# Altium footprint library MOLEX SMD.PcbLib: 54 footprints (part 4 of 4)
Each footprint in its own frame and in the unit in brackets; x right, y up, seen from the top. Pads: shape width x height; smd on the part's side, far side on the other; paste and mask are expansions set on the pad; w line width, h text height; cw(c..) or ccw(c..) is an arc to the next point about the centre after c.
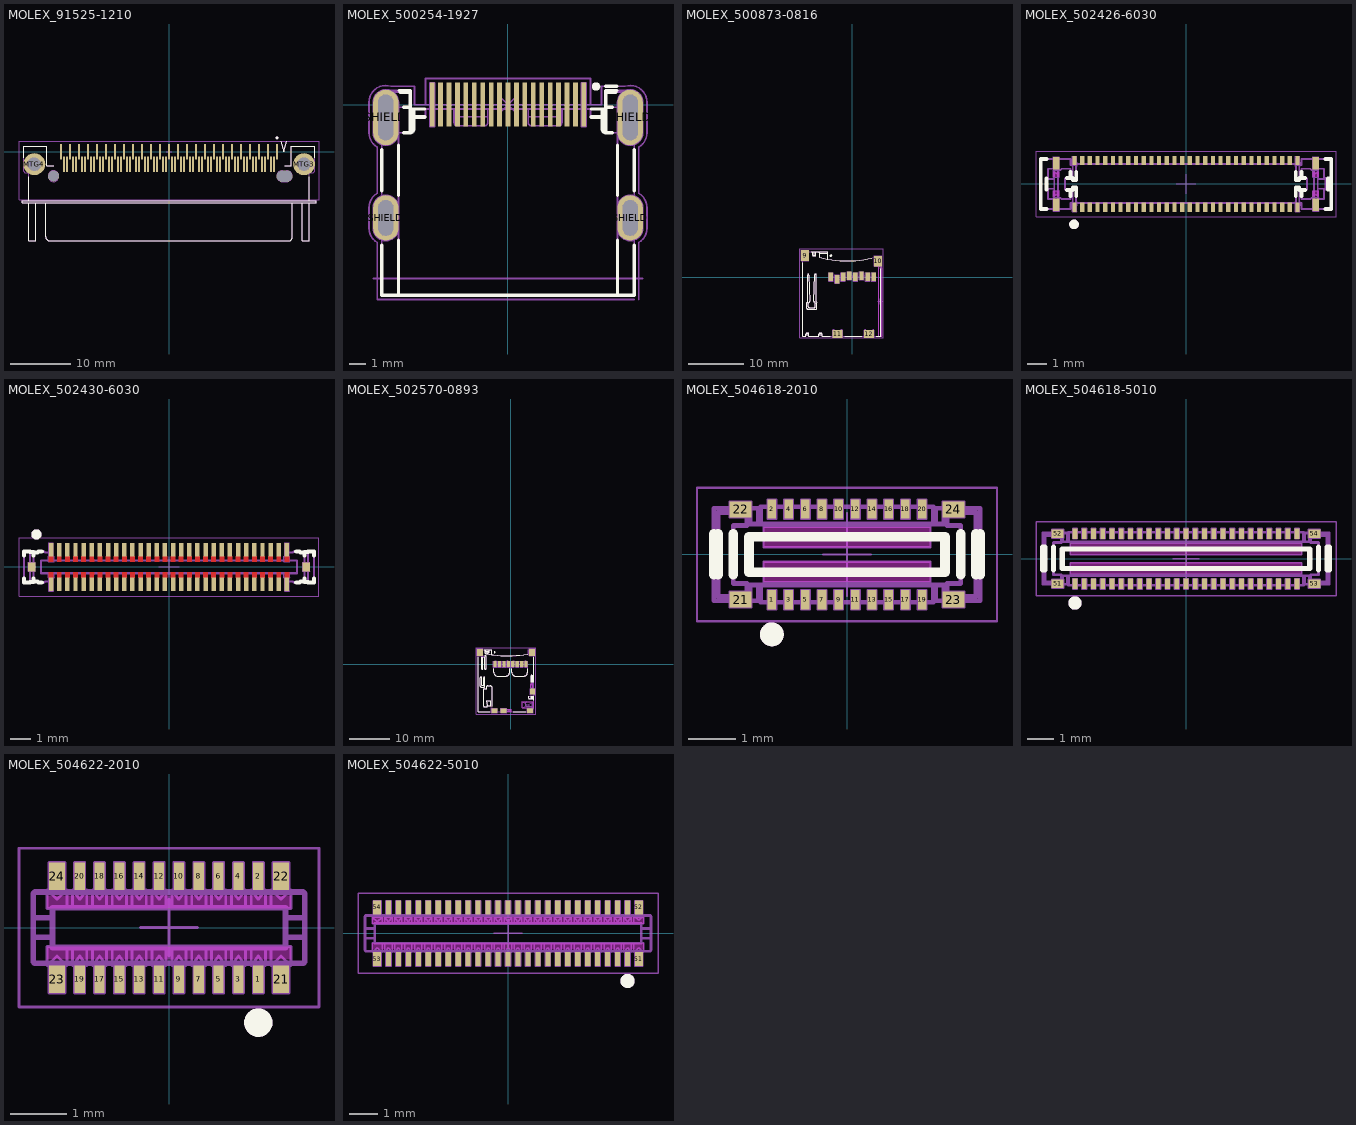
[diagram p3: the footprints below, top view; thin cyan lines are the x and y axes]

## MOLEX_91525-1210 [mm] "0.50mm (.020\") Pitch LaneLink I/O Latch Receptacle, 12 Lane, Cx4 Ethernet, 24 Circuits, 2 Screw Holes"
height 11
pads (77):
  rect 0.31x2.6 smd: G1(18,0) G2(16.5,0) G3(15,0) G4(13.5,0) G5(12,0) G6(10.5,0) G7(9,0) G8(7.5,0) G9(6,0) G10(4.5,0) G11(3,0) G12(1.5,0) G13(0,0) G14(-1.5,0) G15(-3,0) G16(-4.5,0) G17(-6,0) G18(-7.5,0) G19(-9,0) G20(-10.5,0) G21(-12,0) G22(-13.5,0) G23(-15,0) G24(-16.5,0) G25(-18,0) S1(17.5,-2.1) S2(17,-2.1) S3(16,-2.1) S4(15.5,-2.1) S5(14.5,-2.1) S6(14,-2.1) S7(13,-2.1) S8(12.5,-2.1) S9(11.5,-2.1) S10(11,-2.1) S11(10,-2.1) S12(9.5,-2.1) S13(8.5,-2.1) S14(8,-2.1) S15(7,-2.1) S16(6.5,-2.1) S17(5.5,-2.1) S18(5,-2.1) S19(4,-2.1) S20(3.5,-2.1) S21(2.5,-2.1) S22(2,-2.1) S23(1,-2.1) S24(0.5,-2.1) S25(-0.5,-2.1) S26(-1,-2.1) S27(-2,-2.1) S28(-2.5,-2.1) S29(-3.5,-2.1) S30(-4,-2.1) S31(-5,-2.1) S32(-5.5,-2.1) S33(-6.5,-2.1) S34(-7,-2.1) S35(-8,-2.1) S36(-8.5,-2.1) S37(-9.5,-2.1) S38(-10,-2.1) S39(-11,-2.1) S40(-11.5,-2.1) S41(-12.5,-2.1) S42(-13,-2.1) S43(-14,-2.1) S44(-14.5,-2.1) S45(-15.5,-2.1) S46(-16,-2.1) S47(-17,-2.1) S48(-17.5,-2.1)
  round 0.5 hole 1.85 unplated mask+0.675: MTG1(-19.245,-4.1)
  oval 2.1x1.35 hole 1.85 slot 2.6 at 0 deg unplated mask+0.25: MTG2(19.255,-4.1)
  round 3.65 hole 2.2: MTG3(22.5,-2.1) MTG4(-22.45,-2.1)
Top Overlay:
  circle w0.25: c18,2.3 r0.125
  lines w0.2: -24.245,-1 -24.245,0.9 -20.345,0.9 -20.345,-2.35 -19.245,-2.35 ; -23.395,-8.5 -23.395,-14.9 -22.195,-14.9 -22.195,-8.5 ; -23.395,-8.2 -23.395,-4.2 ; -20.56,-8.5 -20.56,-14.2 ccw(c-19.86,-14.2) -19.86,-14.9 19.87,-14.9 ccw(c19.87,-14.2) 20.57,-14.2 20.57,-8.5 ; 18.6,1.7 19.1,0 19.6,1.7 ; 19.255,-2.35 20.355,-2.35 20.355,0.9 24.255,0.9 24.255,-1 ; 22.205,-8.5 22.205,-14.9 23.405,-14.9 23.405,-8.5 ; 23.405,-8.2 23.405,-4.2 ; -24.495,-8.5 -24.495,-8.2 24.505,-8.2 24.505,-8.5 -24.495,-8.5
Mechanical 8:
  lines w0.1: -25,-8 25,-8
  text "PCB Edge" at -3.175,-7.525 h1.02
Mechanical 13:
  circle w0.1: c-22.445,-2.1 r1.1
  circle w0.1: c-19.245,-4.1 r0.91
  circle w0.1: c22.455,-2.1 r1.1
  lines w0.1: -23.545,-2.1 -22.445,-2.1 -22.445,-3.2 ; -19.245,-5.01 -19.245,-4.1 -18.335,-4.1 ; 17.955,-4.1 18.865,-4.1 18.865,-5.01 ; 19.255,-4.454 19.255,-4.1 19.554,-4.1 ; 20.555,-4.1 19.645,-4.1 19.645,-5.01 ; 22.455,-3.2 22.455,-2.1 23.555,-2.1 ; 18.865,-5.01 cw(c18.865,-4.1) 18.865,-3.19 19.645,-3.19 cw(c19.645,-4.1) 19.645,-5.01 ; 18.865,-5.01 19.645,-5.01
Mechanical 14:
  circle w0.25: c18,2.3 r0.125
  lines w0.1: -23.395,-8.5 -23.395,-14.9 -22.195,-14.9 -22.195,-8.5 ; -23.395,-8.2 -23.395,-3.71 -23.595,-3.51 -24.045,-3.51 -24.245,-3.31 -24.245,0.9 -20.345,0.9 -20.345,-2.35 -19.245,-2.35 ; -20.56,-8.5 -20.56,-14.2 ccw(c-19.86,-14.2) -19.86,-14.9 19.87,-14.9 ccw(c19.87,-14.2) 20.57,-14.2 20.57,-8.5 ; 19.255,-2.35 20.355,-2.35 20.355,0.9 24.255,0.9 24.255,-3.31 24.055,-3.51 23.605,-3.51 23.405,-3.71 23.405,-8.2 ; 22.205,-8.5 22.205,-14.9 23.405,-14.9 23.405,-8.5 ; -24.495,-8.5 -24.495,-8.2 24.505,-8.2 24.505,-8.5 -24.495,-8.5
  lines w0.2: 18.6,1.7 19.1,0 19.6,1.7
Mechanical 15:
  lines w0.05: -0.5,0 0.5,0 ; 0,-0.5 0,0.5 ; -25,-8 25,-8 25,1.7 -25,1.7 -25,-8
3D body "MOLEX_91525-1210.stp": height 11.05, standoff -2.35, extent -24.458,-14.898 24.542,1.002

## MOLEX_500254-1927 [mm] "19 Contacts, Pitch 0.5mm, Right Angle, HDMI Receptacle"
height 6.18
pads (23):
  rect 0.28x2.6 smd: 1(4.5,0) 2(4,0) 3(3.5,0) 4(3,0) 5(2.5,0) 6(2,0) 7(1.5,0) 8(1,0) 9(0.5,0) 10(0,0) 11(-0.5,0) 12(-1,0) 13(-1.5,0) 14(-2,0) 15(-2.5,0) 16(-3,0) 17(-3.5,0) 18(-4,0) 19(-4.5,0)
  oval 1.5x2.7 hole 0.9 slot 2.1 at 90 deg: SHIELD(-7.25,-6.72) SHIELD(7.25,-6.72)
  oval 1.5x3.3 hole 0.9 slot 2.7 at 90 deg: SHIELD(-7.25,-0.76) SHIELD(7.25,-0.76)
Top Overlay:
  circle w0.25: c5.225,1.075 r0.125
  lines w0.2: -7.5,-8.34 -7.5,-11.31 7.5,-11.31 7.5,-8.34 ; -7.5,-5.1 -7.5,-2.68 ; -6.5,-11.31 -6.5,-8.055 ; -6.5,-5.385 -6.5,-2.395 ; -6.467,0.84 -5.8,0.84 -5.8,-1.66 ; -6.388,0.74 -5.8,0.74 ; -6.2,-1.66 -5.8,-1.66 ; -6.2,-0.16 -5.8,-0.16 ; -5.8,-0.26 -4.94,-0.26 ; -5.6,-0.26 -5.6,-0.71 -4.94,-0.71 ; -4.94,-0.76 -5.6,-0.76 -5.6,-1.46 cw(c-5.8,-1.46) -5.8,-1.66 ; 4.94,-0.76 5.6,-0.76 5.6,-1.46 ccw(c5.8,-1.46) 5.8,-1.66 ; 4.94,-0.71 5.6,-0.71 5.6,-0.26 ; 4.94,-0.26 5.8,-0.26 ; 5.8,-0.16 6.2,-0.16 ; 5.8,0.74 6.388,0.74 ; 5.8,1.09 6.467,1.09 ; 6.2,-1.66 5.8,-1.66 ; 6.467,0.84 5.8,0.84 5.8,-1.66 ; 6.5,-11.31 6.5,-8.055 ; 6.5,-5.385 6.5,-2.395 ; 7.5,-5.1 7.5,-2.68
Mechanical 8:
  lines w0.1: -8,-10.31 0,-10.31 8,-10.31 ; -7.75,-7.32 -7.25,-7.32 ; -7.75,-6.72 -7.25,-6.72 ; -7.75,-6.12 -7.25,-6.12 ; -7.75,-1.66 -7.25,-1.66 ; -7.75,-0.76 -7.25,-0.76 ; -7.75,0.14 -7.25,0.14 ; -7.25,-7.82 -7.25,-7.32 ; -7.25,-7.22 -7.25,-6.72 ; -7.25,-6.22 -7.25,-6.72 ; -7.25,-5.62 -7.25,-6.12 ; -7.25,-2.16 -7.25,-1.66 ; -7.25,-1.26 -7.25,-0.76 ; -7.25,-0.26 -7.25,-0.76 ; -7.25,0.64 -7.25,0.14 ; -6.75,-7.32 -7.25,-7.32 ; -6.75,-6.72 -7.25,-6.72 ; -6.75,-6.12 -7.25,-6.12 ; -6.75,-1.66 -7.25,-1.66 ; -6.75,-0.76 -7.25,-0.76 ; -6.75,0.14 -7.25,0.14 ; -5,0 -4.5,0 ; -4.5,-0.5 -4.5,0 ; -4.5,0.5 -4.5,0 ; -4,-0.5 -4,0 -4,0.5 ; -3.5,-0.5 -3.5,0 -3.5,0.5 ; -3,-0.5 -3,0 -3,0.5 ; -2.5,-0.5 -2.5,0 -2.5,0.5 ; -2,-0.5 -2,0 -2,0.5 ; -1.5,-0.5 -1.5,0 -1.5,0.5 ; -1,-0.5 -1,0 -1,0.5 ; -0.5,-0.5 -0.5,0 -0.5,0.5 ; -0.354,-0.354 0,0 ; -0.354,0.354 0,0 ; 0,-0.5 0,0 ; 0,0.5 0,0 ; 0.354,-0.354 0,0 ; 0.354,0.354 0,0 ; 0.5,-0.5 0.5,0 0.5,0.5 ; 1,-0.5 1,0 1,0.5 ; 1.5,-0.5 1.5,0 1.5,0.5 ; 2,-0.5 2,0 2,0.5 ; 2.5,-0.5 2.5,0 2.5,0.5 ; 3,-0.5 3,0 3,0.5 ; 3.5,-0.5 3.5,0 3.5,0.5 ; 4,-0.5 4,0 4,0.5 ; 4.5,-0.5 4.5,0 ; 4.5,0.5 4.5,0 ; 5,0 4.5,0 ; 6.75,-7.32 7.25,-7.32 ; 6.75,-6.72 7.25,-6.72 ; 6.75,-6.12 7.25,-6.12 ; 6.75,-1.66 7.25,-1.66 ; 6.75,-0.76 7.25,-0.76 ; 6.75,0.14 7.25,0.14 ; 7.25,-7.82 7.25,-7.32 ; 7.25,-7.22 7.25,-6.72 ; 7.25,-6.22 7.25,-6.72 ; 7.25,-5.62 7.25,-6.12 ; 7.25,-2.16 7.25,-1.66 ; 7.25,-1.26 7.25,-0.76 ; 7.25,-0.26 7.25,-0.76 ; 7.25,0.64 7.25,0.14 ; 7.75,-7.32 7.25,-7.32 ; 7.75,-6.72 7.25,-6.72 ; 7.75,-6.12 7.25,-6.12 ; 7.75,-1.66 7.25,-1.66 ; 7.75,-0.76 7.25,-0.76 ; 7.75,0.14 7.25,0.14 ; -4.5,0 4.5,0 ; 4.64,-1.3 4.64,1.3 ; 4.64,-1.3 4.64,1.3 ; 4.64,-1.3 4.64,1.3 ; 4.64,-1.3 4.64,1.3 ; 4.64,-1.3 4.64,1.3 ; 4.64,-1.3 4.64,1.3 ; 4.64,-1.3 4.64,1.3 ; 4.64,-1.3 4.64,1.3 ; 4.64,-1.3 4.64,1.3 ; 4.64,-1.3 4.64,1.3 ; 4.64,-1.3 4.36,-1.3 4.36,1.3 4.64,1.3 ; 4.64,-1.3 4.64,1.3 ; -8,-7.32 ccw(c-7.25,-7.32) -6.5,-7.32 -6.5,-6.12 ccw(c-7.25,-6.12) -8,-6.12 -8,-7.32 ; -8,-1.66 ccw(c-7.25,-1.66) -6.5,-1.66 -6.5,0.14 ccw(c-7.25,0.14) -8,0.14 -8,-1.66 ; -7.7,-7.32 ccw(c-7.25,-7.32) -6.8,-7.32 -6.8,-6.12 ccw(c-7.25,-6.12) -7.7,-6.12 -7.7,-7.32 ; -7.7,-1.66 ccw(c-7.25,-1.66) -6.8,-1.66 -6.8,0.14 ccw(c-7.25,0.14) -7.7,0.14 -7.7,-1.66 ; -4.64,-1.3 -4.64,1.3 -4.36,1.3 -4.36,-1.3 -4.64,-1.3 ; 6.5,-7.32 ccw(c7.25,-7.32) 8,-7.32 8,-6.12 ccw(c7.25,-6.12) 6.5,-6.12 6.5,-7.32 ; 6.5,-1.66 ccw(c7.25,-1.66) 8,-1.66 8,0.14 ccw(c7.25,0.14) 6.5,0.14 6.5,-1.66 ; 6.8,-7.32 ccw(c7.25,-7.32) 7.7,-7.32 7.7,-6.12 ccw(c7.25,-6.12) 6.8,-6.12 6.8,-7.32 ; 6.8,-1.66 ccw(c7.25,-1.66) 7.7,-1.66 7.7,0.14 ccw(c7.25,0.14) 6.8,0.14 6.8,-1.66
Mechanical 14:
  lines w0.1: -7.5,-1.66 -5.8,-1.66 ; -7.5,-1.06 -7,-1.06 ; -7.5,-0.66 cw(c-7.15,-0.66) -7.15,-0.31 -7,-0.31 ; -7,-1.66 -7,0.24 -7.5,0.24 -7.5,-11.31 7.5,-11.31 7.5,0.24 7,0.24 7,-1.66 ; -7,-0.16 -5.8,-0.16 ; -6.95,-0.16 -6.95,0.84 ; -6.85,-0.16 -6.85,0.74 ; -6.5,-11.31 -6.5,-1.66 ; -5.8,-0.26 5.8,-0.26 ; -5.8,0.74 -6.85,0.74 ; -5.6,-0.26 -5.6,-0.71 -4.9,-0.71 ; -4.9,-0.26 -4.9,-0.76 -5.6,-0.76 -5.6,-1.46 cw(c-5.8,-1.46) -5.8,-1.66 ; -3.2,-0.71 -1.2,-0.71 ; -3.2,-0.26 -3.2,-1.06 ccw(c-3,-1.06) -3,-1.26 -1.4,-1.26 ccw(c-1.4,-1.06) -1.2,-1.06 -1.2,-0.26 ; 1.2,-0.71 3.2,-0.71 ; 1.2,-0.26 1.2,-1.06 ccw(c1.4,-1.06) 1.4,-1.26 3,-1.26 ccw(c3,-1.06) 3.2,-1.06 3.2,-0.26 ; 4.9,-0.71 5.6,-0.71 5.6,-0.26 ; 4.9,-0.26 4.9,-0.76 5.6,-0.76 5.6,-1.46 ccw(c5.8,-1.46) 5.8,-1.66 ; 5.8,-0.16 7,-0.16 ; 5.8,0.74 6.85,0.74 ; 6.5,-11.31 6.5,-1.66 ; 6.85,-0.16 6.85,0.74 ; 6.95,-0.16 6.95,0.84 ; 7,-1.06 7.5,-1.06 ; 7,-0.31 7.15,-0.31 cw(c7.15,-0.66) 7.5,-0.66 ; 7.5,-1.66 5.8,-1.66 ; -6.95,0.84 -6.85,0.74 ; -6.95,0.84 -5.8,0.84 -5.8,-1.66 ; 5.8,-1.66 5.8,0.84 6.95,0.84 ; 6.85,0.74 6.95,0.84
Mechanical 15:
  lines w0.1: 7.5,-11.56 -7.75,-11.56 -7.75,-8.186 cw(c-7.25,-7.32) -8.25,-7.32 -8.25,-6.12 cw(c-7.25,-6.12) -7.75,-5.254 -7.75,-2.526 cw(c-7.25,-1.66) -8.25,-1.66 -8.25,0.14 cw(c-7.25,0.14) -6.938,1.09 -5.55,1.09 -5.55,-0.01 -4.89,-0.01 -4.89,1.55 4.89,1.55 4.89,-0.01 5.55,-0.01 5.55,1.09 6.938,1.09 cw(c7.25,0.14) 8.25,0.14 8.25,-1.66 cw(c7.25,-1.66) 7.75,-2.526 7.75,-5.254 cw(c7.25,-6.12) 8.25,-6.12 8.25,-7.32 cw(c7.25,-7.32) 7.75,-8.186 7.75,-11.56
3D body "MOLEX_500254-1927.stp": height 6.18, standoff -2.2, extent -7.5,-11.31 7.5,0.84

## MOLEX_500873-0816 [mm] "1.10mm Pitch, Surface Mount, Normal Mount MicroSD Memory Card Connector"
height 1.88
pads (12):
  rect 0.8x1.5 smd: 1(-3.85,0.1) 2(-2.75,-0.3) 3(-1.65,0.1) 4(-0.55,0.3) 5(0.55,0.1) 6(1.65,0.3) 7(2.75,0.1) 8(3.85,0.1)
  rect 1.4x1.9 smd: 9(-8.51,3.951) 10(4.64,2.951)
  rect 1.8x1.4 smd: 11(-2.66,-10.199) 12(3.04,-10.199)
Top Layer keep-out:
  lines w0.1: 4.74,-10.599 5.34,-10.599 5.34,1.725 4.74,1.725 4.74,-10.599
Top Overlay:
  circle w0.25: c-3.875,3.925 r0.125
  lines w0.2: -8.91,2.601 -8.91,-10.599 -8.36,-10.599 -8.36,-10.249 cw(c-8.16,-10.249) -8.16,-10.049 -8.01,-10.049 cw(c-8.01,-10.249) -7.81,-10.242 ; -8.36,-10.3 -7.81,-10.3 ; -7.81,-10.249 -7.81,-10.6 -6.01,-10.6 -6.01,-10.25 cw(c-5.81,-10.25) -5.81,-10.05 -5.66,-10.05 cw(c-5.66,-10.25) -5.46,-10.243 ; -7.41,4.601 -4.4,4.601 -4.4,3.277 ; -7.16,4.601 -7.16,4.001 ccw(c-7.06,4.001) -7.06,3.901 -6.66,3.901 ccw(c-6.66,4.001) -6.56,4.001 -6.56,4.601 ; -7.08,4.601 -7.08,4.021 ccw(c-7.06,4.021) -7.06,4.001 -6.66,4.001 ccw(c-6.66,4.021) -6.64,4.021 -6.64,4.601 ; -6.11,4.601 -5.91,4.401 ; -6.01,-10.3 -5.46,-10.3 ; -5.46,-10.601 -5.46,-10.25 ; -5.46,-10.599 -3.96,-10.599 ; -4.4,4.401 -5.91,4.401 ; -1.36,-10.599 1.74,-10.599 ; 3.54,3.492 cw(c-0.96,22.979) -5.91,3.601 -5.91,4.401 ; 4.34,-10.599 5.09,-10.599 5.09,1.601 ; -8.21,-5.549 ccw(c-8.01,-5.549) -8.01,-5.749 -6.61,-5.749 ccw(c-6.61,-5.549) -6.41,-5.549 -6.41,-4.549 -6.493,-4.424 cw(c-6.41,-4.369) -6.51,-4.369 -6.51,0.474 ccw(c-6.635,0.474) -6.76,0.478 -6.927,-4.294 ccw(c-6.827,-4.297) -6.903,-4.362 -6.66,-4.649 -6.66,-5.249 cw(c-6.86,-5.249) -6.86,-5.449 -7.76,-5.449 cw(c-7.76,-5.249) -7.96,-5.249 -7.96,-4.649 -7.679,-4.414 ccw(c-7.744,-4.337) -7.644,-4.334 -7.81,0.428 ccw(c-7.935,0.424) -8.06,0.424 -8.06,-4.396 cw(c-8.16,-4.396) -8.105,-4.479 -8.21,-4.549 -8.21,-5.549
Mechanical 8:
  lines w0.1: -9.01,3.951 -8.51,3.951 ; -8.51,3.451 -8.51,3.951 ; -8.51,4.451 -8.51,3.951 ; -8.01,3.951 -8.51,3.951 ; -4.35,0.1 -3.85,0.1 ; -3.85,-0.4 -3.85,0.1 ; -3.85,0.6 -3.85,0.1 ; -3.35,0.1 -3.85,0.1 ; -3.25,-0.3 -2.75,-0.3 ; -3.16,-10.199 -2.66,-10.199 ; -2.75,-0.8 -2.75,-0.3 ; -2.75,0.2 -2.75,-0.3 ; -2.66,-10.699 -2.66,-10.199 ; -2.66,-9.699 -2.66,-10.199 ; -2.25,-0.3 -2.75,-0.3 ; -2.16,-10.199 -2.66,-10.199 ; -2.15,0.1 -1.65,0.1 ; -1.76,-10.599 -1.76,-9.499 ; -1.65,-0.4 -1.65,0.1 ; -1.65,0.6 -1.65,0.1 ; -1.15,0.1 -1.65,0.1 ; -1.05,0.3 -0.55,0.3 ; -0.55,-0.2 -0.55,0.3 ; -0.55,0.8 -0.55,0.3 ; -0.354,-0.354 0,0 ; -0.354,0.354 0,0 ; -0.05,0.3 -0.55,0.3 ; 0.05,0.1 0.55,0.1 ; 0.354,-0.354 0,0 ; 0.354,0.354 0,0 ; 0.55,-0.4 0.55,0.1 ; 0.55,0.6 0.55,0.1 ; 1.05,0.1 0.55,0.1 ; 1.15,0.3 1.65,0.3 ; 1.65,-0.2 1.65,0.3 ; 1.65,0.8 1.65,0.3 ; 2.15,0.3 1.65,0.3 ; 2.25,0.1 2.75,0.1 ; 2.54,-10.199 3.04,-10.199 ; 2.75,-0.4 2.75,0.1 ; 2.75,0.6 2.75,0.1 ; 3.04,-10.699 3.04,-10.199 ; 3.04,-9.699 3.04,-10.199 ; 3.25,0.1 2.75,0.1 ; 3.35,0.1 3.85,0.1 ; 3.54,-10.199 3.04,-10.199 ; 3.85,-0.4 3.85,0.1 ; 3.85,0.6 3.85,0.1 ; 4.14,2.951 4.64,2.951 ; 4.35,0.1 3.85,0.1 ; 4.54,-4.299 5.04,-4.299 ; 4.64,2.451 4.64,2.951 ; 4.64,3.451 4.64,2.951 ; 5.04,-4.799 5.04,-4.299 ; 5.04,-3.799 5.04,-4.299 ; 5.14,2.951 4.64,2.951 ; 5.54,-4.299 5.04,-4.299 ; -1.76,-9.499 -1.76,-10.899 -3.56,-10.899 -3.56,-9.499 -1.76,-9.499 ; 5.34,2.001 4.74,2.001 4.74,-10.599 5.34,-10.599 5.34,2.001 ; 5.34,2.001 3.94,2.001 3.94,3.901 5.34,3.901 5.34,2.001 ; -9.21,3.001 -9.21,4.901 -7.81,4.901 -7.81,3.001 -9.21,3.001 ; -4.25,-0.65 -4.25,0.85 -3.45,0.85 -3.45,-0.65 -4.25,-0.65 ; -3.15,-1.05 -3.15,0.45 -2.35,0.45 -2.35,-1.05 -3.15,-1.05 ; -2.05,-0.65 -2.05,0.85 -1.25,0.85 -1.25,-0.65 -2.05,-0.65 ; -0.95,-0.45 -0.95,1.05 -0.15,1.05 -0.15,-0.45 -0.95,-0.45 ; 0.15,-0.65 0.15,0.85 0.95,0.85 0.95,-0.65 0.15,-0.65 ; 1.25,-0.45 1.25,1.05 2.05,1.05 2.05,-0.45 1.25,-0.45 ; 2.14,-10.899 2.14,-9.499 3.94,-9.499 3.94,-10.899 2.14,-10.899 ; 2.35,-0.65 2.35,0.85 3.15,0.85 3.15,-0.65 2.35,-0.65 ; 3.45,-0.65 3.45,0.85 4.25,0.85 4.25,-0.65 3.45,-0.65
Mechanical 14:
  lines w0.1: -8.36,-10.3 -7.81,-10.3 ; -7.81,-10.249 -7.81,-10.6 -6.01,-10.6 -6.01,-10.25 cw(c-5.81,-10.25) -5.81,-10.05 -5.66,-10.05 cw(c-5.66,-10.25) -5.46,-10.243 ; -7.81,-10.242 ccw(c-8.01,-10.249) -8.01,-10.049 -8.16,-10.049 ccw(c-8.16,-10.249) -8.36,-10.249 -8.36,-10.599 -8.91,-10.599 -8.91,3.001 -7.96,3.001 ccw(c-7.96,3.151) -7.95,3.301 -8.71,3.301 cw(c-8.71,3.501) -8.91,3.501 -8.91,4.401 cw(c-8.71,4.401) -8.71,4.601 -4.4,4.601 -4.4,3.277 ; -7.16,4.601 -7.16,4.001 ccw(c-7.06,4.001) -7.06,3.901 -6.66,3.901 ccw(c-6.66,4.001) -6.56,4.001 -6.56,4.601 ; -7.08,4.601 -7.08,4.021 ccw(c-7.06,4.021) -7.06,4.001 -6.66,4.001 ccw(c-6.66,4.021) -6.64,4.021 -6.64,4.601 ; -6.11,4.601 -5.91,4.401 ; -6.01,-10.3 -5.46,-10.3 ; -5.46,-10.601 -5.46,-10.25 ; -5.46,-10.599 -3.41,-10.599 -3.41,-9.649 -3.26,-9.649 ; -4.4,4.401 -5.91,4.401 ; -3.51,-10.599 -3.51,-9.524 cw(c-3.385,-9.524) -3.26,-9.524 -3.26,-10.399 ccw(c-3.06,-10.399) -3.06,-10.599 -2.26,-10.599 ccw(c-2.26,-10.399) -2.06,-10.399 -2.06,-9.524 cw(c-1.935,-9.524) -1.81,-9.524 -1.81,-10.599 ; -2.06,-9.649 -1.91,-9.649 -1.91,-10.599 2.29,-10.599 2.29,-9.649 2.44,-9.649 ; 2.19,-10.599 2.19,-9.524 cw(c2.315,-9.524) 2.44,-9.524 2.44,-10.399 ccw(c2.64,-10.399) 2.64,-10.599 3.44,-10.599 ccw(c3.44,-10.399) 3.64,-10.399 3.64,-9.524 cw(c3.765,-9.524) 3.89,-9.524 3.89,-10.599 ; 3.64,-9.649 3.79,-9.649 3.79,-10.599 5.09,-10.599 5.09,3.601 3.99,3.601 cw(c-0.96,22.979) -5.91,3.601 -5.91,4.401 ; -8.21,-5.549 ccw(c-8.01,-5.549) -8.01,-5.749 -6.61,-5.749 ccw(c-6.61,-5.549) -6.41,-5.549 -6.41,-4.549 -6.493,-4.424 cw(c-6.41,-4.369) -6.51,-4.369 -6.51,0.474 ccw(c-6.635,0.474) -6.76,0.478 -6.927,-4.294 ccw(c-6.827,-4.297) -6.903,-4.362 -6.66,-4.649 -6.66,-5.249 cw(c-6.86,-5.249) -6.86,-5.449 -7.76,-5.449 cw(c-7.76,-5.249) -7.96,-5.249 -7.96,-4.649 -7.679,-4.414 ccw(c-7.744,-4.337) -7.644,-4.334 -7.81,0.428 ccw(c-7.935,0.424) -8.06,0.424 -8.06,-4.396 cw(c-8.16,-4.396) -8.105,-4.479 -8.21,-4.549 -8.21,-5.549
  text "1" at -5.45,-0.525 h1.2
Mechanical 15:
  lines w0.05: -9.46,-10.849 5.565,-10.849 5.565,5.151 -9.46,5.151 -9.46,-10.849
3D body "MOLEX_500873-0816.stp": height 1.88, standoff 0, extent -8.91,-10.6 5.09,4.601

## MOLEX_502426-6030 [mm] "0.40mm Pitch SlimStack™ Dual Row 60 Circuits Surface Mount Vertical Receptacle Board-to-Board With Vacuum Tape"
height 1.2
pads (64):
  rect 0.22x0.48 smd: 1(-5.8,-1.212) 2(-5.8,1.212) 3(-5.4,-1.212) 4(-5.4,1.212) 5(-5,-1.212) 6(-5,1.212) 7(-4.6,-1.212) 8(-4.6,1.212) 9(-4.2,-1.212) 10(-4.2,1.212) 11(-3.8,-1.212) 12(-3.8,1.212) 13(-3.4,-1.212) 14(-3.4,1.212) 15(-3,-1.212) 16(-3,1.212) 17(-2.6,-1.212) 18(-2.6,1.212) 19(-2.2,-1.212) 20(-2.2,1.212) 21(-1.8,-1.212) 22(-1.8,1.212) 23(-1.4,-1.212) 24(-1.4,1.212) 25(-1,-1.212) 26(-1,1.212) 27(-0.6,-1.212) 28(-0.6,1.212) 29(-0.2,-1.212) 30(-0.2,1.212) 31(0.2,-1.212) 32(0.2,1.212) 33(0.6,-1.212) 34(0.6,1.212) 35(1,-1.212) 36(1,1.212) 37(1.4,-1.212) 38(1.4,1.212) 39(1.8,-1.212) 40(1.8,1.212) 41(2.2,-1.212) 42(2.2,1.212) 43(2.6,-1.212) 44(2.6,1.212) 45(3,-1.212) 46(3,1.212) 47(3.4,-1.212) 48(3.4,1.212) 49(3.8,-1.212) 50(3.8,1.212) 51(4.2,-1.212) 52(4.2,1.212) 53(4.6,-1.212) 54(4.6,1.212) 55(5,-1.212) 56(5,1.212) 57(5.4,-1.212) 58(5.4,1.212) 59(5.8,-1.212) 60(5.8,1.212)
  rect 0.32x0.65 smd: 61(-6.75,-1.085) 61(-6.75,1.085) 62(6.75,-1.085) 62(6.75,1.085)
Top Layer keep-out:
  rectangle: -6.91,0.35 -6.59,0.66
  region: -6.59,-0.35 -6.91,-0.35 -6.91,-0.66 -6.59,-0.66
  rectangle: 6.59,0.35 6.91,0.66
  region: 6.91,-0.35 6.59,-0.35 6.59,-0.66 6.91,-0.66
Top Overlay:
  circle w0.25: c-5.825,-2.1 r0.125
  lines w0.2: -7.26,-1.3 -7.55,-1.3 -7.55,1.3 -7.26,1.3 ; -7.25,-0.3 -7.25,0.3 ; -6.19,-0.31 -5.89,-0.31 -5.89,-0.19 -5.71,-0.19 -5.71,-0.625 ; -6.19,0.31 -5.89,0.31 -5.89,0.19 -5.71,0.19 -5.71,0.625 ; -6,-0.625 -6,-0.31 ; -6,0.31 -6,0.625 ; 5.71,-0.625 5.71,-0.19 5.89,-0.19 5.89,-0.31 6.19,-0.31 ; 5.71,0.625 5.71,0.201 5.89,0.201 5.89,0.31 6.19,0.31 ; 6,-0.625 6,-0.31 ; 6,0.31 6,0.625 ; 7.26,-1.3 7.55,-1.3 7.55,1.3 7.26,1.3 ; 7.55,-0.3 7.38,-0.3 7.38,0.3 7.55,0.3
Mechanical 8:
  lines w0.05: -0.5,0 0,0 ; 0,-0.5 0,0 ; 0,0.5 0,0 ; 0.5,0 0,0 ; -6.91,-1.41 -6.59,-1.41 ; -6.91,-1.41 -6.91,-0.76 -6.59,-0.76 -6.59,-1.41 ; -6.91,-1.41 -6.75,-1.085 -6.59,-1.41 ; -6.91,-0.7 -6.59,-0.7 ; -6.91,-0.7 -6.91,-0.35 -6.59,-0.35 -6.59,-0.7 ; -6.91,-0.7 -6.75,-0.525 -6.59,-0.7 ; -6.91,0.7 -6.91,0.35 -6.59,0.35 -6.59,0.7 ; -6.91,0.7 -6.59,0.7 ; -6.91,0.7 -6.75,0.525 -6.59,0.7 ; -6.91,1.41 -6.91,0.76 -6.59,0.76 -6.59,1.41 ; -6.91,1.41 -6.59,1.41 ; -6.91,1.41 -6.75,1.085 -6.59,1.41 ; -5.91,-1.45 -5.91,-0.975 -5.69,-0.975 -5.69,-1.45 ; -5.91,-1.45 -5.69,-1.45 ; -5.91,-1.45 -5.8,-1.212 -5.69,-1.45 ; -5.91,1.45 -5.91,0.975 -5.69,0.975 -5.69,1.45 ; -5.91,1.45 -5.69,1.45 ; -5.91,1.45 -5.8,1.212 -5.69,1.45 ; 5.69,-1.45 5.69,-0.975 5.91,-0.975 5.91,-1.45 ; 5.69,-1.45 5.91,-1.45 ; 5.69,-1.45 5.8,-1.212 5.91,-1.45 ; 5.69,1.45 5.69,0.975 5.91,0.975 5.91,1.45 ; 5.69,1.45 5.91,1.45 ; 5.69,1.45 5.8,1.212 5.91,1.45 ; 6.59,-1.41 6.59,-0.76 6.91,-0.76 6.91,-1.41 ; 6.59,-1.41 6.91,-1.41 ; 6.59,-1.41 6.75,-1.085 6.91,-1.41 ; 6.59,-0.7 6.59,-0.35 6.91,-0.35 6.91,-0.7 ; 6.59,-0.7 6.91,-0.7 ; 6.59,-0.7 6.75,-0.525 6.91,-0.7 ; 6.59,0.7 6.91,0.7 ; 6.59,0.7 6.59,0.35 6.91,0.35 6.91,0.7 ; 6.59,0.7 6.75,0.525 6.91,0.7 ; 6.59,1.41 6.91,1.41 ; 6.59,1.41 6.59,0.76 6.91,0.76 6.91,1.41 ; 6.59,1.41 6.75,1.085 6.91,1.41
Mechanical 14:
  circle w0.25: c-5.825,-2.1 r0.125
  lines w0.1: -7.17,-0.3 -7.25,-0.3 -7.25,0.3 -7.17,0.3 ; -6.85,-0.79 -7.17,-0.79 -7.17,-0.25 -6.85,-0.25 ; -6.85,0.25 -7.17,0.25 -7.17,0.79 -6.85,0.79 ; -6.65,-0.732 -6.52,-0.732 -6.47,-0.79 -6,-0.79 -6,-0.31 ; -6.65,0.732 -6.52,0.732 -6.47,0.79 -6,0.79 -6,0.31 ; -6,-0.64 -5.89,-0.64 ; -5.91,-0.98 -6,-0.98 -6,-1.3 -7.55,-1.3 -7.55,1.3 -6,1.3 -6,0.98 -5.91,0.98 ; -5.89,-0.31 -6.24,-0.31 cw(c-6.24,-0.26) -6.29,-0.26 -6.29,0.26 cw(c-6.24,0.26) -6.24,0.31 -5.89,0.31 ; -5.69,-0.98 5.69,-0.98 ; -5.69,1.03 5.69,1.03 ; 5.89,-0.31 6.24,-0.31 ccw(c6.24,-0.26) 6.29,-0.26 6.29,0.26 ccw(c6.24,0.26) 6.24,0.31 5.89,0.31 ; 5.91,-0.98 6,-0.98 6,-1.3 7.55,-1.3 7.55,1.3 6,1.3 6,0.98 5.91,0.98 ; 6,-0.31 6,-0.79 6.47,-0.79 6.52,-0.732 6.65,-0.732 ; 6,0.31 6,0.79 6.47,0.79 6.52,0.732 6.65,0.732 ; 6.85,-0.79 7.17,-0.79 7.17,-0.25 6.85,-0.25 ; 6.85,0.25 7.17,0.25 7.17,0.79 6.85,0.79 ; 7.17,-0.3 7.25,-0.3 7.25,0.3 7.17,0.3 ; 7.55,-0.3 7.38,-0.3 7.38,0.3 7.55,0.3 ; -6.85,-0.95 -6.85,0.95 -6.65,0.95 -6.65,-0.95 -6.85,-0.95 ; -5.91,-1.13 -5.91,-0.94 -5.89,-0.94 -5.89,-0.19 -5.71,-0.19 -5.71,-0.94 -5.69,-0.94 -5.69,-1.13 -5.73,-1.13 -5.73,-1.3 -5.87,-1.3 -5.87,-1.13 -5.91,-1.13 ; -5.91,0.94 -5.91,1.13 -5.87,1.13 -5.87,1.3 -5.73,1.3 -5.73,1.13 -5.69,1.13 -5.69,0.94 -5.71,0.94 -5.71,0.19 -5.89,0.19 -5.89,0.94 -5.91,0.94 ; 5.69,-1.13 5.69,-0.94 5.71,-0.94 5.71,-0.19 5.89,-0.19 5.89,-0.94 5.91,-0.94 5.91,-1.13 5.87,-1.13 5.87,-1.3 5.73,-1.3 5.73,-1.13 5.69,-1.13 ; 5.69,0.94 5.71,0.94 5.71,0.201 5.89,0.201 5.89,0.94 5.91,0.94 5.91,1.13 5.87,1.13 5.87,1.3 5.73,1.3 5.73,1.13 5.69,1.13 5.69,0.94 ; 6.65,-0.95 6.85,-0.95 6.85,0.95 6.65,0.95 6.65,-0.95